# Altium footprint library FOOTPRINT.PcbLib: 132 footprints (part 2 of 9)
Each footprint in its own frame and in the unit in brackets; x right, y up, seen from the top. Pads: shape width x height; smd on the part's side, far side on the other; paste and mask are expansions set on the pad; w line width, h text height; cw(c..) or ccw(c..) is an arc to the next point about the centre after c.
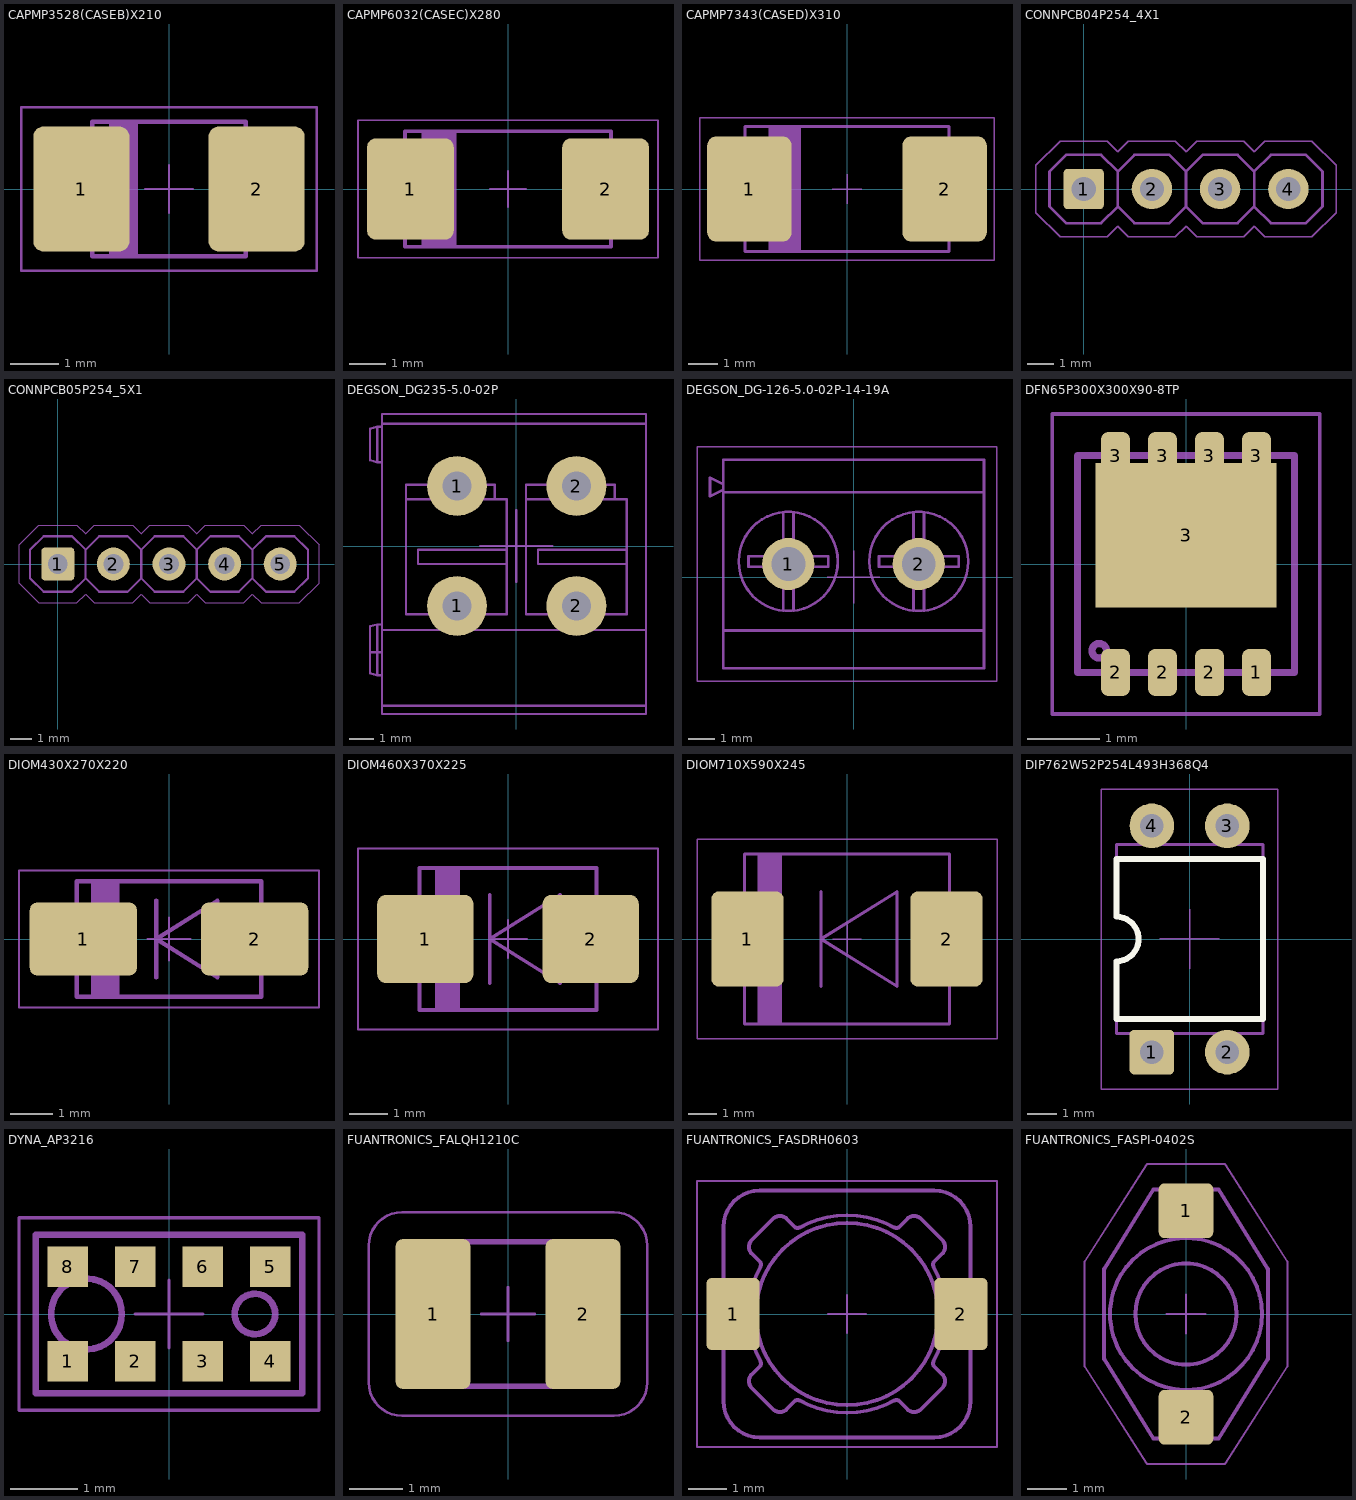
[diagram p1: the footprints below, top view; thin cyan lines are the x and y axes]

## CAPMP3528(CASEB)X210 [mm] "Polarized Molded Capacitor, 2-Leads, Body 3.50x2.80mm"
height 2.1
pads (2):
  rrect20% 2x2.6 smd: 1(-1.825,0) 2(1.825,0)
Top Assembly:
  rectangle: -1.25,-1.4 -0.65,1.4
  lines w0.1: -1.6,-1.1 -1.6,1.1 ; -1.6,-1.1 -1.6,-1.4 1.6,-1.4 1.6,-1.1 ; -1.6,-1.1 -1.75,-1.1 -1.75,1.1 -1.6,1.1 ; -1.6,1.1 -1.6,1.4 1.6,1.4 ; 1.6,-1.1 1.75,-1.1 1.75,1.1 1.6,1.1 ; 1.6,-1.1 1.6,1.1 ; 1.6,1.1 1.6,1.4 ; 1.6,1.4 1.6,1.4
Top Courtyard:
  lines w0.05: -3.075,-1.7 -3.075,1.7 3.075,1.7 3.075,-1.7 -3.075,-1.7
Top Component Center:
  lines w0.05: -0.5,0 0.5,0 ; 0,-0.5 0,0.5
Top Designator:
  text "'.Designator'" at -0.5,0.351 h0.65
  text "'.Comment'" at -0.45,-0.735 h0.65
3D body "CP_EIA-3528-21_Kemet-B.step": height 2.1, standoff 0, extent -1.75,-1.4 1.75,1.4

## CAPMP6032(CASEC)X280 [mm] "Polarized Molded Capacitor, 2-Leads, Body 6.00x3.20mm"
height 2.8
pads (2):
  rrect20% 2.4x2.8 smd: 1(-2.7,0) 2(2.7,0)
Top Assembly:
  rectangle: -2.4,-1.6 -1.425,1.6
  lines w0.1: -2.85,-1.1 -2.85,1.1 ; -2.85,-1.1 -2.85,-1.6 2.85,-1.6 2.85,-1.1 ; -2.85,-1.1 -3,-1.1 -3,1.1 -2.85,1.1 ; -2.85,1.1 -2.85,1.6 2.85,1.6 2.85,1.1 ; 2.85,-1.1 3,-1.1 3,1.1 2.85,1.1 ; 2.85,-1.1 2.85,1.1
Top Courtyard:
  lines w0.05: -4.15,-1.9 4.15,-1.9 4.15,1.9 -4.15,1.9 -4.15,-1.9
Top Component Center:
  lines w0.05: -0.5,0 0.5,0 ; 0,-0.5 0,0.5
Top Designator:
  text "'.Designator'" at -1.025,0.351 h0.65
  text "'.Comment'" at -0.975,-0.735 h0.65
3D body "CP_EIA-6032-28_Kemet-C.step": height 2.8, standoff 0, extent -3,-1.6 3,1.6

## CAPMP7343(CASED)X310 [mm] "Polarized Molded Capacitor, 2-Leads, Body 7.30x4.30mm"
height 3.1
pads (2):
  rrect20% 2.9x3.6 smd: 1(-3.35,0) 2(3.35,0)
Top Assembly:
  rectangle: -2.7,-2.15 -1.575,2.15
  lines w0.1: -3.5,-1.2 -3.5,1.2 ; -3.5,-1.2 -3.5,-2.15 3.5,-2.15 3.5,-1.2 ; -3.5,-1.2 -3.65,-1.2 -3.65,1.2 -3.5,1.2 ; -3.5,1.2 -3.5,2.15 3.5,2.15 3.5,1.2 ; 3.5,-1.2 3.5,1.2 ; 3.5,-1.2 3.65,-1.2 3.65,1.2 3.5,1.2
Top Courtyard:
  lines w0.05: -5.05,-2.45 -5.05,2.45 5.05,2.45 5.05,-2.45 -5.05,-2.45
Top Component Center:
  lines w0.05: -0.5,0 0.5,0 ; 0,-0.5 0,0.5
Top Designator:
  text "'.Designator'" at -0.825,0.351 h0.65
  text "'.Comment'" at -0.775,-0.735 h0.65
3D body "CP_EIA-7343-31_Kemet-D.step": height 3.1, standoff 0, extent -3.65,-2.15 3.65,2.15

## CONNPCB04P254_4X1 [mm] "PLS-04, 2.54mm, 1 Row, Body 10.16x2.54mm, Lead Width 0.64mm"
pads (4):
  rrect20% 1.5x1.5 hole 0.9: 1(0,0)
  round 1.5 hole 0.9: 2(2.54,0) 3(5.08,0) 4(7.62,0)
Top Assembly:
  lines w0.1: 1.27,-0.65 0.65,-1.27 -0.65,-1.27 -1.27,-0.65 -1.27,0.65 -0.65,1.27 0.65,1.27 1.27,0.65 ; 1.27,-0.65 1.89,-1.27 3.19,-1.27 3.81,-0.65 ; 1.27,-0.65 1.27,0.65 ; 1.27,0.65 1.89,1.27 3.19,1.27 3.81,0.65 ; 3.81,-0.65 3.81,0.65 ; 3.81,-0.65 4.43,-1.27 5.73,-1.27 6.35,-0.65 ; 3.81,0.65 4.43,1.27 5.73,1.27 6.35,0.65 ; 6.35,-0.65 6.35,0.65 ; 6.35,-0.65 6.97,-1.27 8.27,-1.27 8.89,-0.65 8.89,0.65 8.27,1.27 6.97,1.27 6.35,0.65 ; -0.325,-0.325 -0.325,0.325 0.325,0.325 0.325,-0.325 -0.325,-0.325 ; 2.215,-0.325 2.865,-0.325 2.865,0.325 2.215,0.325 2.215,-0.325 ; 4.755,-0.325 4.755,0.325 5.405,0.325 5.405,-0.325 4.755,-0.325 ; 7.295,-0.325 7.295,0.325 7.945,0.325 7.945,-0.325 7.295,-0.325
Top Courtyard:
  lines w0.05: -1.775,-0.875 -0.875,-1.775 0.875,-1.775 1.27,-1.38 1.665,-1.775 3.415,-1.775 3.81,-1.38 4.205,-1.775 5.955,-1.775 6.35,-1.38 6.745,-1.775 8.495,-1.775 9.395,-0.875 9.395,0.875 8.495,1.775 6.745,1.775 6.35,1.38 5.955,1.775 4.205,1.775 3.81,1.38 3.415,1.775 1.665,1.775 1.27,1.38 0.875,1.775 -0.875,1.775 -1.775,0.875 -1.775,-0.875
Top Component Center:
  lines w0.05: -0.5,0 0.5,0 ; 0,-0.5 0,0.5
Top Designator:
  text "'.Designator'" at -1.14,2.183 h0.65
  text "'.Comment'" at -1.14,1.48 h0.65

## CONNPCB05P254_5X1 [mm] "PLS-05, 2.54mm, 1 Row, Body 12.70x2.54mm, Lead Width 0.64mm"
pads (5):
  rrect20% 1.5x1.5 hole 0.9: 1(0,0)
  round 1.5 hole 0.9: 2(2.54,0) 3(5.08,0) 4(7.62,0) 5(10.16,0)
Top Assembly:
  lines w0.1: 1.27,-0.65 1.27,0.65 ; 1.27,-0.65 1.89,-1.27 3.19,-1.27 3.81,-0.65 ; 1.27,-0.65 0.65,-1.27 -0.65,-1.27 -1.27,-0.65 -1.27,0.65 -0.65,1.27 0.65,1.27 1.27,0.65 ; 1.27,0.65 1.89,1.27 3.19,1.27 3.81,0.65 ; 3.81,-0.65 4.43,-1.27 5.73,-1.27 6.35,-0.65 ; 3.81,-0.65 3.81,0.65 ; 3.81,0.65 4.43,1.27 5.73,1.27 6.35,0.65 ; 6.35,-0.65 6.97,-1.27 8.27,-1.27 8.89,-0.65 ; 6.35,-0.65 6.35,0.65 ; 6.35,0.65 6.97,1.27 8.27,1.27 8.89,0.65 ; 8.89,-0.65 9.51,-1.27 10.81,-1.27 11.43,-0.65 11.43,0.65 10.81,1.27 9.51,1.27 8.89,0.65 ; 8.89,-0.65 8.89,0.65 ; -0.325,-0.325 0.325,-0.325 0.325,0.325 -0.325,0.325 -0.325,-0.325 ; 2.215,-0.325 2.215,0.325 2.865,0.325 2.865,-0.325 2.215,-0.325 ; 4.755,-0.325 5.405,-0.325 5.405,0.325 4.755,0.325 4.755,-0.325 ; 7.295,-0.325 7.945,-0.325 7.945,0.325 7.295,0.325 7.295,-0.325 ; 9.835,-0.325 9.835,0.325 10.485,0.325 10.485,-0.325 9.835,-0.325
Top Courtyard:
  lines w0.05: -1.775,-0.875 -1.775,0.875 -0.875,1.775 0.875,1.775 1.27,1.38 1.665,1.775 3.415,1.775 3.81,1.38 4.205,1.775 5.955,1.775 6.35,1.38 6.745,1.775 8.495,1.775 8.89,1.38 9.285,1.775 11.035,1.775 11.935,0.875 11.935,-0.875 11.035,-1.775 9.285,-1.775 8.89,-1.38 8.495,-1.775 6.745,-1.775 6.35,-1.38 5.955,-1.775 4.205,-1.775 3.81,-1.38 3.415,-1.775 1.665,-1.775 1.27,-1.38 0.875,-1.775 -0.875,-1.775 -1.775,-0.875
Top Component Center:
  lines w0.05: -0.5,0 0.5,0 ; 0,-0.5 0,0.5
Top Designator:
  text "'.Comment'" at -1.14,1.48 h0.65
  text "'.Designator'" at -1.14,2.183 h0.65

## DEGSON_DG235-5.0-02P [mm]
pads (4):
  round 2.5 hole 1.2: 1(-2.475,-2.5) 1(-2.475,2.5) 2(2.5,-2.5) 2(2.5,2.5)
Top Assembly:
  lines w0.1: -6.1,-4.43 -5.8,-4.43 -5.6,-4.43 ; -5.6,-5.39 -5.8,-5.39 ; -5.6,-3.5 5.4,-3.5 ; -5.6,-3.27 -5.8,-3.27 ; -5.6,3.49 -5.8,3.49 ; -5.6,4.97 -5.8,4.97 ; -5.6,5.1 5.4,5.1 ; -4.6,1.95 -0.4,1.95 -0.4,-0.75 ; -0.9,1.95 -0.9,2.55 -4.6,2.55 -4.6,-2.85 -0.4,-2.85 -0.4,-0.75 ; -0.4,-0.15 -4.1,-0.15 -4.1,-0.75 -0.4,-0.75 ; 0.4,1.95 4.6,1.95 4.6,-0.75 ; 4.1,1.95 4.1,2.55 0.4,2.55 0.4,-2.85 4.6,-2.85 4.6,-0.75 ; 4.6,-0.15 0.9,-0.15 0.9,-0.75 4.6,-0.75 ; 5.4,-6.65 -5.6,-6.65 ; -5.8,-5.39 -5.8,-3.27 ; -5.8,-5.39 -6.1,-5.3 -6.1,-3.35 -5.8,-3.27 ; -5.8,-3.27 -5.8,-3.27 ; -5.8,3.49 -5.8,4.97 ; -5.8,3.49 -6.1,3.58 -6.1,4.88 -5.8,4.97 ; -5.8,4.97 -5.8,4.97 ; -5.6,-6.65 -5.6,5.5 5.4,5.5 5.4,-6.651 5.4,-6.724 5.4,-6.791 5.4,-6.852 5.4,-6.903 5.4,-6.945 5.4,-6.975 5.4,-6.994 5.4,-7 -5.6,-7 -5.6,-6.994 -5.6,-6.975 -5.6,-6.945 -5.6,-6.903 -5.6,-6.852 -5.6,-6.791 -5.6,-6.723 -5.6,-6.65
Top Component Center:
  lines w0.1: -1.5,0 1.5,0 ; 0,-1.5 0,1.5
Top Designator:
  text "'.Designator'" at -1.625,-5.296 h0.65
  text "'.Comment'" at -1.625,-5.907 h0.65
3D body "DG235-5.0-02P-1Y-00A(H).stp": height 15.51, standoff -3.59, extent -6.1,-7 5.4,5.5

## DEGSON_DG-126-5.0-02P-14-19A [mm] "Terminal block, 5.0mm pitch, 10.5x8.0mm"
height 10.9
pads (2):
  round 2 hole 1.3: 1(-2.5,0.5) 2(2.5,0.5)
Top Assembly:
  circle w0.1: c2.5,0.6 r1.9
  circle w0.1: c-2.5,0.6 r1.9
  lines w0.1: -5,-2.05 5,-2.05 ; -5,3.25 5,3.25 ; -5,3.35 -5.5,3.1 -5.5,3.8 -5,3.55 ; -2.7,-1.288 -2.7,0.4 -4.028,0.4 ; -2.7,2.49 -2.7,0.8 -4.028,0.8 ; -2.3,-1.288 -2.3,0.4 -0.975,0.4 ; -2.3,2.49 -2.3,0.8 -0.975,0.8 ; 2.3,-1.288 2.3,0.4 0.975,0.4 0.975,0.8 2.3,0.8 2.3,2.49 ; 2.7,-1.288 2.7,0.4 4.028,0.4 4.028,0.8 2.7,0.8 2.7,2.49 ; -4.028,0.4 -4.028,0.8 ; -4.028,0.4 -4.028,0.8 ; -0.975,0.4 -0.975,0.8 ; -0.975,0.4 -0.975,0.8 ; -5,-3.5 -5,4.5 5,4.5 5,-3.5 -5,-3.5
Top Courtyard:
  lines w0.05: -6,-4 5.5,-4 5.5,5 -6,5 -6,-4
Top Component Center:
  lines w0.05: -1,0 1,0 ; 0,-1 0,1
Top Designator:
  text "'.Designator'" at -1.175,0.301 h0.65
  text "'.Comment'" at -1.175,-0.549 h0.65
3D body "DEGSON_DG-126-5.0-02P-14-19A.x_t": height 10.9, standoff -3.9, extent -5.5,-3.5 5,4.5

## DFN65P300X300X90-8TP [mm] "DFN8, 8-Leads, Thermal Pad, Body 3.00x3.00mm"
height 0.9
pads (9):
  rrect50% 0.4x0.65 smd: 1(0.975,-1.5) 2(-0.975,-1.5) 2(-0.325,-1.5) 2(0.325,-1.5) 3(-0.975,1.5) 3(-0.325,1.5) 3(0.325,1.5) 3(0.975,1.5)
  rect 2.5x2 smd paste-2: 3(0,0.4)
Top Paste:
  region: 0,-0.15 -0.08,-0.15 -0.227,-0.089 -0.339,0.023 -0.4,0.17 -0.4,0.25 -0.4,0.33 -0.339,0.477 -0.227,0.589 -0.08,0.65 0,0.65 0.08,0.65 0.227,0.589 0.339,0.477 0.4,0.33 0.4,0.25 0.4,0.17 0.339,0.023 0.227,-0.089 0.08,-0.15
  region: -0.8,-0.5 -0.74,-0.5 -0.63,-0.454 -0.546,-0.37 -0.5,-0.26 -0.5,-0.2 -0.5,-0.14 -0.546,-0.03 -0.63,0.054 -0.74,0.1 -0.8,0.1 -0.86,0.1 -0.97,0.054 -1.054,-0.03 -1.1,-0.14 -1.1,-0.2 -1.1,-0.26 -1.054,-0.37 -0.97,-0.454 -0.86,-0.5
  region: -0.8,0.4 -0.74,0.4 -0.63,0.446 -0.546,0.53 -0.5,0.64 -0.5,0.7 -0.5,0.76 -0.546,0.87 -0.63,0.954 -0.74,1 -0.8,1 -0.86,1 -0.97,0.954 -1.054,0.87 -1.1,0.76 -1.1,0.7 -1.1,0.64 -1.054,0.53 -0.97,0.446 -0.86,0.4
  region: 0.8,-0.5 0.74,-0.5 0.63,-0.454 0.546,-0.37 0.5,-0.26 0.5,-0.2 0.5,-0.14 0.546,-0.03 0.63,0.054 0.74,0.1 0.8,0.1 0.86,0.1 0.97,0.054 1.054,-0.03 1.1,-0.14 1.1,-0.2 1.1,-0.26 1.054,-0.37 0.97,-0.454 0.86,-0.5
  region: 0.8,0.4 0.74,0.4 0.63,0.446 0.546,0.53 0.5,0.64 0.5,0.7 0.5,0.76 0.546,0.87 0.63,0.954 0.74,1 0.8,1 0.86,1 0.97,0.954 1.054,0.87 1.1,0.76 1.1,0.7 1.1,0.64 1.054,0.53 0.97,0.446 0.86,0.4
Top Assembly:
  circle w0.1: c-1.2,-1.2 r0.1
  lines w0.1: -1.125,-1.5 -1.125,-1.6 -0.825,-1.6 -0.825,-1.5 ; -1.125,1.5 -1.125,1.6 -0.825,1.6 -0.825,1.5 ; -0.475,-1.5 -0.475,-1.6 -0.175,-1.6 -0.175,-1.5 ; -0.475,1.5 -0.475,1.6 -0.175,1.6 -0.175,1.5 ; 0.175,-1.5 0.175,-1.6 0.475,-1.6 0.475,-1.5 ; 0.175,1.5 0.175,1.6 0.475,1.6 0.475,1.5 ; 0.825,-1.5 0.825,-1.6 1.125,-1.6 1.125,-1.5 ; 0.825,1.5 0.825,1.6 1.125,1.6 1.125,1.5 ; -1.5,-1.5 -1.5,1.5 1.5,1.5 1.5,-1.5 -1.5,-1.5
Top Courtyard:
  lines w0.05: -1.85,-2.075 1.85,-2.075 1.85,2.075 -1.85,2.075 -1.85,-2.075
Top Component Center:
  lines w0.05: -0.5,0 0.5,0 ; 0,-0.5 0,0.5
Top Designator:
  text "'.Comment'" at -1.5,-0.474 h0.65
  text "'.Designator'" at -1.5,0.387 h0.65
3D body: height 0.9, standoff 0, extent -1.5,-1.5 1.5,1.5
3D body: height 0.88, standoff 0, extent -1.325,-1.325 -1.075,-1.075
3D body: height 0.1, standoff 0, extent 0.175,1.5 0.475,1.6
3D body: height 0.1, standoff 0, extent -0.475,1.5 -0.175,1.6
3D body: height 0.1, standoff 0, extent 0.825,-1.6 1.125,-1.5
3D body: height 0.1, standoff 0, extent 0.175,-1.6 0.475,-1.5
3D body: height 0.1, standoff 0, extent -0.475,-1.6 -0.175,-1.5
3D body: height 0.1, standoff 0, extent -1.125,-1.6 -0.825,-1.5
3D body: height 0.1, standoff 0, extent 0.825,1.5 1.125,1.6
3D body: height 0.1, standoff 0, extent -1.125,1.5 -0.825,1.6
3D body: height 0.1, standoff 0, extent -1.6,-0.05 -1.5,0.05
3D body: height 0.1, standoff 0, extent 1.5,-0.05 1.6,0.05

## DIOM430X270X220 [mm] "Molded Diode, DO-214AC(SMA), 2-Leads, Body 4.30x2.70mm"
height 2.2
pads (2):
  rrect20% 2.5x1.7 smd: 1(-2,0) 2(2,0)
Top Assembly:
  rectangle: -1.825,-1.35 -1.15,1.35
  lines w0.1: -2.15,-0.7 -2.5,-0.7 -2.5,0.7 -2.15,0.7 ; -0.3,-0.9 -0.3,0.9 ; 2.15,-0.7 2.5,-0.7 2.5,0.7 2.15,0.7 ; -2.15,-1.35 2.15,-1.35 2.15,1.35 -2.15,1.35 -2.15,-1.35 ; -0.3,0 1.129,-0.893 1.129,0.893 -0.3,0
Top Courtyard:
  lines w0.05: -3.5,-1.6 -3.5,1.6 3.5,1.6 3.5,-1.6 -3.5,-1.6
Top Component Center:
  lines w0.05: -0.5,0 0.5,0 ; 0,-0.5 0,0.5
Top Designator:
  text "'.Designator'" at -0.725,0.276 h0.65
  text "'.Comment'" at -0.725,-0.635 h0.65
3D body "DO-214AC_SMA.x_t": height 2.21, standoff 0.01, extent -2.5,-1.35 2.5,1.35

## DIOM460X370X225 [mm] "Molded Diode, DO-214AA(SMB), 2-Leads, Body 4.60x3.70mm"
height 2.25
pads (2):
  rrect20% 2.5x2.3 smd: 1(-2.15,0) 2(2.15,0)
Top Assembly:
  rectangle: -1.9,-1.85 -1.25,1.85
  lines w0.1: -2.3,-1.05 -2.65,-1.05 -2.65,1.05 -2.3,1.05 ; -0.475,-1.15 -0.475,1.15 ; 2.3,-1.05 2.65,-1.05 2.65,1.05 2.3,1.05 ; -2.3,-1.85 -2.3,1.85 2.3,1.85 2.3,-1.85 -2.3,-1.85 ; -0.475,0 1.354,1.143 1.354,-1.143 -0.475,0
Top Courtyard:
  lines w0.05: -3.9,-2.35 -3.9,2.35 3.9,2.35 3.9,-2.35 -3.9,-2.35
Top Component Center:
  lines w0.05: -0.5,0 0.5,0 ; 0,-0.5 0,0.5
Top Designator:
  text "'.Designator'" at -0.725,0.276 h0.65
  text "'.Comment'" at -0.725,-0.635 h0.65
3D body "DO-214AA_SMB.x_t": height 2.26, standoff 0.01, extent -2.65,-1.85 2.65,1.85

## DIOM710X590X245 [mm] "Molded Diode, DO-214AB(SMC), 2-Leads, Body 7.20x5.90mm"
height 2.45
pads (2):
  rrect20% 2.5x3.3 smd: 1(-3.45,0) 2(3.45,0)
Top Assembly:
  rectangle: -3.1,-2.95 -2.25,2.95
  lines w0.1: -3.55,-1.5 -3.9,-1.5 -3.9,1.5 -3.55,1.5 ; -0.9,-1.65 -0.9,1.65 ; 3.55,-1.5 3.9,-1.5 3.9,1.5 3.55,1.5 ; -3.55,-2.95 -3.55,2.95 3.55,2.95 3.55,-2.95 -3.55,-2.95 ; -0.9,0 1.729,1.643 1.729,-1.643 -0.9,0
Top Courtyard:
  lines w0.05: -5.2,-3.45 5.2,-3.45 5.2,3.45 -5.2,3.45 -5.2,-3.45
Top Component Center:
  lines w0.05: -0.5,0 0.5,0 ; 0,-0.5 0,0.5
Top Designator:
  text "'.Comment'" at -1.25,-0.635 h0.65
  text "'.Designator'" at -1.25,0.276 h0.65
3D body "DO-214AB-SMC.x_t": height 2.46, standoff 0.01, extent -3.9,-2.95 3.9,2.95

## DIP762W52P254L493H368Q4 [mm] "Lead Span 7.62; Lead Width 0.52; Pitch 2.54; Body Length 4.93; Body Height 3.68; Pin Qty 4"
height 3.68
pads (4):
  rrect20% 1.5x1.5 hole 0.8: 1(-1.27,-3.81)
  round 1.5 hole 0.8: 2(1.27,-3.81) 3(1.27,3.81) 4(-1.27,3.81)
Top Overlay:
  lines w0.2: -2.465,-0.75 ccw(c-2.465,0) -2.465,0.75 -2.465,2.7 2.475,2.7 2.475,1.925 2.475,-2.7 -2.465,-2.7 -2.465,-0.75 ; -2.465,-0.75 -2.465,-0.75
Top Assembly:
  lines w0.1: -1.533,-3.175 -1.533,-3.925 -1.008,-3.925 -1.008,-3.175 ; -1.532,3.175 -1.532,3.925 -1.007,3.925 -1.007,3.175 ; 1.007,-3.175 1.007,-3.925 1.532,-3.925 1.532,-3.175 ; 1.008,3.175 1.008,3.925 1.533,3.925 1.533,3.175 ; -2.465,0.75 cw(c-2.465,0) -2.455,-0.75 -2.465,-0.75 -2.465,-3.175 2.465,-3.175 2.465,3.175 -2.465,3.175 -2.465,0.75 ; -2.465,0.75 -2.465,0.75
Top Courtyard:
  lines w0.05: -2.975,-5.05 -2.975,-3.175 -2.975,5.05 -1.225,5.05 2.975,5.05 2.975,3.175 2.975,-5.05 1.5,-5.05 -2.975,-5.05
Top Component Center:
  lines w0.05: -1.008,0 1.007,0 ; 0,-1 0,1
Top Designator:
  text "'.Comment'" at -1.25,-0.635 h0.65
  text "'.Designator'" at -1.25,0.276 h0.65
3D body "DIP-4_W7.62mm.step": height 3.68, standoff -3.3, extent -2.465,-3.937 2.465,3.937

## DYNA_AP3216 [mm] "8-Leads, Body 3.94x2.36"
height 1.35
pads (8):
  rect 0.6x0.6 smd: 1(-1.5,-0.7) 2(-0.5,-0.7) 3(0.5,-0.7) 4(1.5,-0.7) 5(1.5,0.7) 6(0.5,0.7) 7(-0.5,0.7) 8(-1.5,0.7)
Top Assembly:
  circle w0.1: c-1.225,0 r0.525
  circle w0.1: c1.275,0 r0.3
  lines w0.1: -1.975,-1.175 1.975,-1.175 1.975,1.175 -1.975,1.175 -1.975,-1.175
Top Courtyard:
  lines w0.05: -2.225,-1.425 2.225,-1.425 2.225,1.425 -2.225,1.425 -2.225,-1.425
Top Component Center:
  lines w0.05: -0.5,0 0.5,0 ; 0,-0.5 0,0.5
Top Designator:
  text "'.Designator'" at -1.825,0.226 h0.65
  text "'.Comment'" at -1.825,-0.627 h0.65
3D body "DYNA_AP3216.x_t": height 1.41, standoff 0.01, extent -1.97,-1.18 1.97,1.18

## FUANTRONICS_FALQH1210C [mm] "Power Inductor, 2-Leads, Body 3.3x2.7mm"
height 2
pads (2):
  rrect20% 1.4x2.8 smd: 1(-1.4,0) 2(1.4,0)
Top Assembly:
  lines w0.1: -1.65,-1.35 -1.65,1.35 1.65,1.35 1.65,-1.35 -1.65,-1.35
Top Courtyard:
  lines w0.05: -2.6,-1.275 ccw(c-1.976,-1.276) -1.977,-1.9 1.977,-1.9 ccw(c1.976,-1.276) 2.6,-1.275 2.6,1.275 ccw(c1.976,1.276) 1.977,1.9 -1.977,1.9 ccw(c-1.976,1.276) -2.6,1.275 -2.6,-1.275
Top Component Center:
  lines w0.05: -0.5,0 0.5,0 ; 0,-0.5 0,0.5
Top Designator:
  text "'.Comment'" at 2.35,-0.81 h0.65
  text "'.Designator'" at 2.35,0.276 h0.65
3D body "FALQH1210C.STEP": height 2.21, standoff 0.01, extent -1.65,-1.35 1.65,1.35

## FUANTRONICS_FASDRH0603 [mm] "Power Inductor, Magnetic Shielded, 2-Leads, Body 6.50x6.50mm"
height 3
pads (2):
  rrect20% 1.4x1.9 smd: 1(-3,0) 2(3,0)
Top Assembly:
  circle w0.1: c0,0 r2.4
  lines w0.1: -3.25,-2.3 ccw(c-2.3,-2.3) -2.3,-3.25 ; -3.25,-2.3 ccw(c-2.3,-2.3) -2.3,-3.25 ; -3.25,-2.3 -3.25,2.3 ; -3.25,-2.3 -3.25,2.3 ; -3.25,2.3 cw(c-2.3,2.3) -2.3,3.25 ; -3.25,2.3 cw(c-2.3,2.3) -2.3,3.25 ; -2.3,-3.25 2.3,-3.25 ; -2.3,-3.25 2.3,-3.25 ; -2.3,3.25 2.3,3.25 ; -2.3,3.25 2.3,3.25 ; 2.3,-3.25 ccw(c2.3,-2.3) 3.25,-2.3 ; 2.3,-3.25 ccw(c2.3,-2.3) 3.25,-2.3 ; 2.3,3.25 cw(c2.3,2.3) 3.25,2.3 ; 2.3,3.25 cw(c2.3,2.3) 3.25,2.3 ; 3.25,-2.3 3.25,2.3 ; 3.25,-2.3 3.25,2.3 ; -2.51,-1.945 cw(c-2.333,-1.768) -2.51,-1.591 -2.294,-1.374 ccw(c-2.364,-1.304) -2.277,-1.255 cw(c0,0) -2.277,1.255 ccw(c-2.364,1.304) -2.294,1.374 -2.51,1.591 cw(c-2.333,1.768) -2.51,1.945 -1.945,2.51 cw(c-1.768,2.333) -1.591,2.51 -1.374,2.294 ccw(c-1.304,2.364) -1.255,2.277 cw(c0,0) 1.255,2.277 ccw(c1.304,2.364) 1.374,2.294 1.591,2.51 cw(c1.768,2.333) 1.945,2.51 2.51,1.945 cw(c2.333,1.768) 2.51,1.591 2.294,1.374 ccw(c2.364,1.304) 2.277,1.255 cw(c0,0) 2.277,-1.255 ccw(c2.364,-1.304) 2.294,-1.374 2.51,-1.591 cw(c2.333,-1.768) 2.51,-1.945 1.945,-2.51 cw(c1.768,-2.333) 1.591,-2.51 1.374,-2.294 ccw(c1.304,-2.364) 1.255,-2.277 cw(c0,0) -1.255,-2.277 ccw(c-1.304,-2.364) -1.374,-2.294 -1.591,-2.51 cw(c-1.768,-2.333) -1.945,-2.51 -2.51,-1.945
Top Courtyard:
  lines w0.05: -3.95,-3.5 3.95,-3.5 3.95,3.5 -3.95,3.5 -3.95,-3.5
Top Component Center:
  lines w0.05: -0.5,0 0.5,0 ; 0,-0.5 0,0.5
Top Designator:
  text "'.Designator'" at -0.475,0.351 h0.65
  text "'.Comment'" at -0.475,-0.735 h0.65
3D body "FASDRH-0603.x_t": height 3, standoff 0, extent -3.25,-3.25 3.25,3.25

## FUANTRONICS_FASPI-0402S [mm] "Power Inductor, 2-Leads, Body 6.60x4.45mm"
height 2.92
pads (2):
  rrect20% 1.4x1.4 smd: 1(0,2.65) 2(0,-2.65)
Top Assembly:
  circle w0.1: c0,0 r1.3
  circle w0.1: c0,0 r1.95
  lines w0.1: -0.781,-3.2 0.833,-3.2 2.1,-1.154 2.1,1.154 0.833,3.2 -0.781,3.2 ; 0.781,-3.2 -0.833,-3.2 -2.1,-1.154 -2.1,1.154 -0.833,3.2 0.781,3.2
Top Courtyard:
  lines w0.05: -2.6,-1.35 -2.6,1.35 -0.999,3.849 0.999,3.85 2.6,1.35 2.6,-1.35 0.999,-3.849 -0.999,-3.85 -2.6,-1.35
Top Component Center:
  lines w0.05: -0.5,0 0.5,0 ; 0,-0.5 0,0.5
Top Designator:
  text "'.Comment'" at -1.225,-0.582 h0.65
  text "'.Designator'" at -1.2,0.054 h0.65
3D body: height 0.7, standoff 0, extent -2.1,-3.2 2.1,3.2
3D body: height 2.7, standoff 0.7, extent -1.95,-1.95 1.95,1.95